# Altium footprint library SAMTEC SMD.PcbLib: 165 footprints (part 12 of 17)
Each footprint in its own frame and in the unit in brackets; x right, y up, seen from the top. Pads: shape width x height; smd on the part's side, far side on the other; paste and mask are expansions set on the pad; w line width, h text height; cw(c..) or ccw(c..) is an arc to the next point about the centre after c.
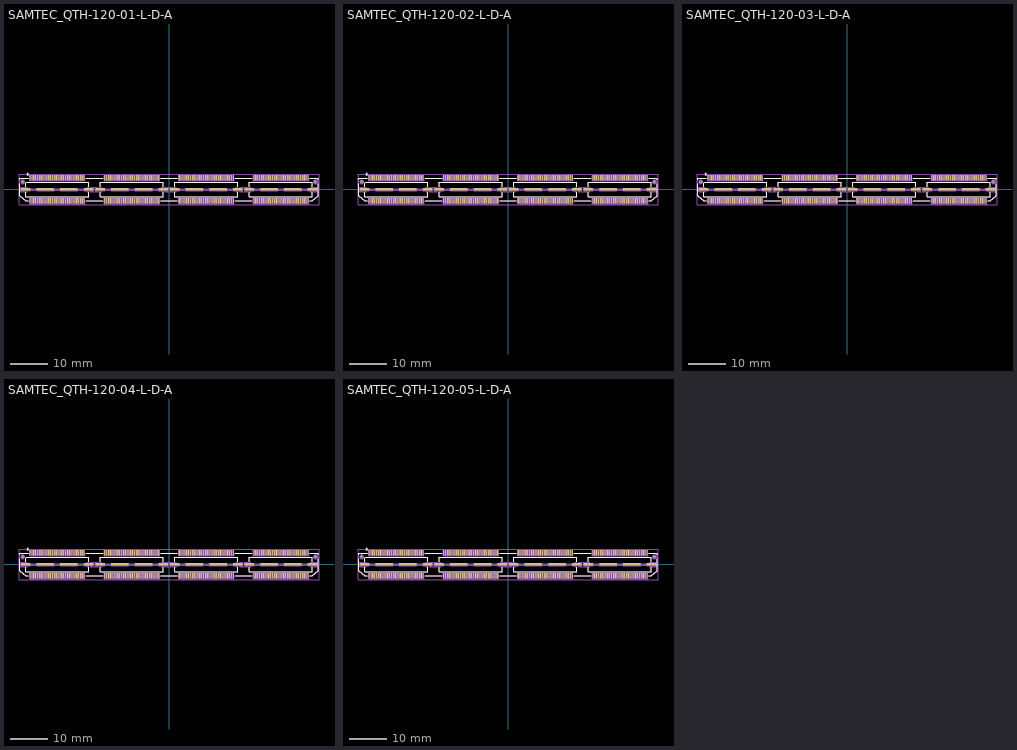
[diagram p11: the footprints below, top view; thin cyan lines are the x and y axes]

## SAMTEC_QTH-120-01-L-D-A [mm] "240  (4x60) Contacts, Pitch 0.5mm, Straight Double Row High Speed Ground Plane Header"
height 4.27
pads (258):
  rect 0.305x1.45 smd mask+0: 1(-37.255,3.086) 2(-37.255,-3.086) 3(-36.755,3.086) 4(-36.755,-3.086) 5(-36.255,3.086) 6(-36.255,-3.086) 7(-35.755,3.086) 8(-35.755,-3.086) 9(-35.255,3.086) 10(-35.255,-3.086) 11(-34.755,3.086) 12(-34.755,-3.086) 13(-34.255,3.086) 14(-34.255,-3.086) 15(-33.755,3.086) 16(-33.755,-3.086) 17(-33.255,3.086) 18(-33.255,-3.086) 19(-32.755,3.086) 20(-32.755,-3.086) 21(-32.255,3.086) 22(-32.255,-3.086) 23(-31.755,3.086) 24(-31.755,-3.086) 25(-31.255,3.086) 26(-31.255,-3.086) 27(-30.755,3.086) 28(-30.755,-3.086) 29(-30.255,3.086) 30(-30.255,-3.086) 31(-29.755,3.086) 32(-29.755,-3.086) 33(-29.255,3.086) 34(-29.255,-3.086) 35(-28.755,3.086) 36(-28.755,-3.086) 37(-28.255,3.086) 38(-28.255,-3.086) 39(-27.755,3.086) 40(-27.755,-3.086) 41(-27.255,3.086) 42(-27.255,-3.086) 43(-26.755,3.086) 44(-26.755,-3.086) 45(-26.255,3.086) 46(-26.255,-3.086) 47(-25.755,3.086) 48(-25.755,-3.086) 49(-25.255,3.086) 50(-25.255,-3.086) 51(-24.755,3.086) 52(-24.755,-3.086) 53(-24.255,3.086) 54(-24.255,-3.086) 55(-23.755,3.086) 56(-23.755,-3.086) 57(-23.255,3.086) 58(-23.255,-3.086) 59(-22.755,3.086) 60(-22.755,-3.086) 61(-17.252,3.086) 62(-17.252,-3.086) 63(-16.752,3.086) 64(-16.752,-3.086) 65(-16.252,3.086) 66(-16.252,-3.086) 67(-15.752,3.086) 68(-15.752,-3.086) 69(-15.252,3.086) 70(-15.252,-3.086) 71(-14.752,3.086) 72(-14.752,-3.086) 73(-14.252,3.086) 74(-14.252,-3.086) 75(-13.752,3.086) 76(-13.752,-3.086) 77(-13.252,3.086) 78(-13.252,-3.086) 79(-12.752,3.086) 80(-12.752,-3.086) 81(-12.252,3.086) 82(-12.252,-3.086) 83(-11.752,3.086) 84(-11.752,-3.086) 85(-11.252,3.086) 86(-11.252,-3.086) 87(-10.752,3.086) 88(-10.752,-3.086) 89(-10.252,3.086) 90(-10.252,-3.086) 91(-9.752,3.086) 92(-9.752,-3.086) 93(-9.252,3.086) 94(-9.252,-3.086) 95(-8.752,3.086) 96(-8.752,-3.086) 97(-8.252,3.086) 98(-8.252,-3.086) 99(-7.752,3.086) 100(-7.752,-3.086) 101(-7.252,3.086) 102(-7.252,-3.086) 103(-6.752,3.086) 104(-6.752,-3.086) 105(-6.252,3.086) 106(-6.252,-3.086) 107(-5.752,3.086) 108(-5.752,-3.086) 109(-5.252,3.086) 110(-5.252,-3.086) 111(-4.752,3.086) 112(-4.752,-3.086) 113(-4.252,3.086) 114(-4.252,-3.086) 115(-3.752,3.086) 116(-3.752,-3.086) 117(-3.252,3.086) 118(-3.252,-3.086) 119(-2.752,3.086) 120(-2.752,-3.086) 121(2.752,3.086) 122(2.752,-3.086) 123(3.251,3.086) 124(3.251,-3.086) 125(3.751,3.086) 126(3.751,-3.086) 127(4.252,3.086) 128(4.252,-3.086) 129(4.751,3.086) 130(4.751,-3.086) 131(5.252,3.086) 132(5.252,-3.086) 133(5.751,3.086) 134(5.751,-3.086) 135(6.251,3.086) 136(6.251,-3.086) 137(6.752,3.086) 138(6.752,-3.086) 139(7.251,3.086) 140(7.251,-3.086) 141(7.752,3.086) 142(7.752,-3.086) 143(8.251,3.086) 144(8.251,-3.086) 145(8.751,3.086) 146(8.751,-3.086) 147(9.252,3.086) 148(9.252,-3.086) 149(9.751,3.086) 150(9.751,-3.086) 151(10.252,3.086) 152(10.252,-3.086) 153(10.751,3.086) 154(10.751,-3.086) 155(11.251,3.086) 156(11.251,-3.086) 157(11.752,3.086) 158(11.752,-3.086) 159(12.251,3.086) 160(12.251,-3.086) 161(12.751,3.086) 162(12.751,-3.086) 163(13.252,3.086) 164(13.252,-3.086) 165(13.751,3.086) 166(13.751,-3.086) 167(14.252,3.086) 168(14.252,-3.086) 169(14.751,3.086) 170(14.751,-3.086) 171(15.251,3.086) 172(15.251,-3.086) 173(15.752,3.086) 174(15.752,-3.086) 175(16.251,3.086) 176(16.251,-3.086) 177(16.751,3.086) 178(16.751,-3.086) 179(17.252,3.086) 180(17.252,-3.086) 181(22.755,3.086) 182(22.755,-3.086) 183(23.255,3.086) 184(23.255,-3.086) 185(23.755,3.086) 186(23.755,-3.086) 187(24.255,3.086) 188(24.255,-3.086) 189(24.755,3.086) 190(24.755,-3.086) 191(25.255,3.086) 192(25.255,-3.086) 193(25.755,3.086) 194(25.755,-3.086) 195(26.255,3.086) 196(26.255,-3.086) 197(26.755,3.086) 198(26.755,-3.086) 199(27.255,3.086) 200(27.255,-3.086) 201(27.755,3.086) 202(27.755,-3.086) 203(28.255,3.086) 204(28.255,-3.086) 205(28.755,3.086) 206(28.755,-3.086) 207(29.255,3.086) 208(29.255,-3.086) 209(29.755,3.086) 210(29.755,-3.086) 211(30.255,3.086) 212(30.255,-3.086) 213(30.755,3.086) 214(30.755,-3.086) 215(31.255,3.086) 216(31.255,-3.086) 217(31.755,3.086) 218(31.755,-3.086) 219(32.255,3.086) 220(32.255,-3.086) 221(32.755,3.086) 222(32.755,-3.086) 223(33.255,3.086) 224(33.255,-3.086) 225(33.755,3.086) 226(33.755,-3.086) 227(34.255,3.086) 228(34.255,-3.086) 229(34.755,3.086) 230(34.755,-3.086) 231(35.255,3.086) 232(35.255,-3.086) 233(35.755,3.086) 234(35.755,-3.086) 235(36.255,3.086) 236(36.255,-3.086) 237(36.755,3.086) 238(36.755,-3.086) 239(37.255,3.086) 240(37.255,-3.086)
  rect 2.54x0.64 smd mask+0: 241(-38.45,0) 244(-21.56,0) 245(-18.447,0) 248(-1.557,0) 249(1.557,0) 252(18.447,0) 253(21.56,0) 256(38.45,0)
  rect 4.7x0.64 smd mask+0: 242(-33.18,0) 243(-26.83,0) 246(-13.177,0) 247(-6.827,0) 250(6.827,0) 251(13.177,0) 254(26.83,0) 255(33.18,0)
  round 0.5 hole 1 unplated mask+0.25: 257(-39.245,2.032) 258(39.245,2.032)
Top Overlay:
  circle w0.25: c-37.897,4.047 r0.125
  lines w0.2: -39.977,1.509 -39.977,-1.639 -38.454,-2.982 -37.807,-2.982 ; -39.977,2.555 -39.977,2.982 -37.807,2.982 ; -38.424,-0.72 -38.424,-1.967 -21.543,-1.967 -21.543,-0.72 ; -38.424,0.72 -38.424,1.664 ; -38.347,1.967 -21.543,1.967 -21.543,0.72 ; -22.202,-2.982 -17.804,-2.982 ; -22.202,2.982 -17.804,2.982 ; -18.437,-0.72 -18.437,-1.967 -1.556,-1.967 -1.556,-0.72 ; -18.437,0.72 -18.437,1.967 -1.556,1.967 -1.556,0.72 ; -2.199,-2.982 2.199,-2.982 ; -2.199,2.982 2.199,2.982 ; 1.551,-0.72 1.551,-1.967 18.431,-1.967 18.431,-0.72 ; 1.551,0.72 1.551,1.967 18.431,1.967 18.431,0.72 ; 17.804,-2.982 22.202,-2.982 ; 17.804,2.982 22.202,2.982 ; 21.538,-0.72 21.538,-1.967 38.419,-1.967 38.419,-0.72 ; 21.538,0.72 21.538,1.967 38.347,1.967 ; 37.807,-2.982 38.449,-2.982 39.972,-1.639 39.972,1.502 ; 37.807,2.982 39.972,2.982 39.972,2.562 ; 38.419,0.72 38.419,1.675
Mechanical 8:
  drawing of 1550 lines, arcs and shapes, not listed
Mechanical 14:
  circle w0.1: c-37.895,4.047 r0.25
  lines w0.1: -38.708,-0.19 -39.438,-0.19 -39.438,0.19 -38.708,0.19 ; -38.424,-0.571 -38.008,-0.571 -38.008,-0.193 -38.159,-0.193 -38.159,0.193 -38.008,0.193 -38.008,0.571 -38.424,0.571 ; -21.543,-0.571 -21.959,-0.571 -21.959,-0.193 -21.808,-0.193 -21.808,0.193 -21.959,0.193 -21.959,0.571 -21.543,0.571 ; -21.069,-0.19 -20.529,-0.19 -20.529,0.19 -21.069,0.19 ; -18.911,-0.19 -19.451,-0.19 -19.451,0.19 -18.911,0.19 ; -18.437,-0.571 -18.02,-0.571 -18.02,-0.193 -18.171,-0.193 -18.171,0.193 -18.02,0.193 -18.02,0.571 -18.437,0.571 ; -1.556,-0.571 -1.972,-0.571 -1.972,-0.193 -1.821,-0.193 -1.821,0.193 -1.972,0.193 -1.972,0.571 -1.556,0.571 ; -1.081,-0.19 -0.542,-0.19 -0.542,0.19 -1.081,0.19 ; 1.076,-0.19 0.537,-0.19 0.537,0.19 1.076,0.19 ; 1.551,-0.571 1.967,-0.571 1.967,-0.193 1.816,-0.193 1.816,0.193 1.967,0.193 1.967,0.571 1.551,0.571 ; 18.431,-0.571 18.015,-0.571 18.015,-0.193 18.166,-0.193 18.166,0.193 18.015,0.193 18.015,0.571 18.431,0.571 ; 18.906,-0.19 19.445,-0.19 19.445,0.19 18.906,0.19 ; 21.063,-0.19 20.524,-0.19 20.524,0.19 21.063,0.19 ; 21.538,-0.571 21.954,-0.571 21.954,-0.193 21.803,-0.193 21.803,0.193 21.954,0.193 21.954,0.571 21.538,0.571 ; 38.419,-0.571 38.003,-0.571 38.003,-0.193 38.154,-0.193 38.154,0.193 38.003,0.193 38.003,0.571 38.419,0.571 ; 38.703,-0.19 39.433,-0.19 39.433,0.19 38.703,0.19 ; -39.977,-1.639 -39.977,2.982 39.972,2.982 39.972,-1.639 38.449,-2.982 -38.454,-2.982 -39.977,-1.639 ; -39.723,-0.635 -39.723,0.631 -38.708,0.631 -38.708,-0.635 -39.723,-0.635 ; -38.424,-1.967 -38.424,1.967 -21.543,1.967 -21.543,-1.967 -38.424,-1.967 ; -38.156,-0.19 -38.156,0.19 -21.811,0.19 -21.811,-0.19 -38.156,-0.19 ; -21.069,-0.635 -21.069,0.635 -18.911,0.635 -18.911,-0.635 -21.069,-0.635 ; -18.437,-1.967 -18.437,1.967 -1.556,1.967 -1.556,-1.967 -18.437,-1.967 ; -18.169,-0.19 -18.169,0.19 -1.824,0.19 -1.824,-0.19 -18.169,-0.19 ; -1.081,-0.635 -1.081,0.635 1.076,0.635 1.076,-0.635 -1.081,-0.635 ; 1.551,-1.967 1.551,1.967 18.431,1.967 18.431,-1.967 1.551,-1.967 ; 1.819,-0.19 1.819,0.19 18.164,0.19 18.164,-0.19 1.819,-0.19 ; 18.906,-0.635 21.063,-0.635 21.063,0.635 18.906,0.635 18.906,-0.635 ; 21.538,-1.967 21.538,1.967 38.419,1.967 38.419,-1.967 21.538,-1.967 ; 21.806,-0.19 21.806,0.19 38.151,0.19 38.151,-0.19 21.806,-0.19 ; 38.703,-0.635 38.703,0.635 39.718,0.635 39.718,-0.635 38.703,-0.635
Mechanical 15:
  lines w0.05: -40.227,-4.061 40.222,-4.061 40.222,4.061 -40.227,4.061 -40.227,-4.061
3D body "SAMTEC_QTH-120-01-L-D-A.stp": height 4.27, standoff -0.73, extent -39.977,-3.553 39.972,3.553

## SAMTEC_QTH-120-02-L-D-A [mm] "240  (4x60) Contacts, Pitch 0.5mm, Straight Double Row High Speed Ground Plane Header (Lead Style 7.26mm)"
height 7.264
pads (258):
  rect 0.305x1.45 smd mask+0: 1(-37.255,3.086) 2(-37.255,-3.086) 3(-36.755,3.086) 4(-36.755,-3.086) 5(-36.255,3.086) 6(-36.255,-3.086) 7(-35.755,3.086) 8(-35.755,-3.086) 9(-35.255,3.086) 10(-35.255,-3.086) 11(-34.755,3.086) 12(-34.755,-3.086) 13(-34.255,3.086) 14(-34.255,-3.086) 15(-33.755,3.086) 16(-33.755,-3.086) 17(-33.255,3.086) 18(-33.255,-3.086) 19(-32.755,3.086) 20(-32.755,-3.086) 21(-32.255,3.086) 22(-32.255,-3.086) 23(-31.755,3.086) 24(-31.755,-3.086) 25(-31.255,3.086) 26(-31.255,-3.086) 27(-30.755,3.086) 28(-30.755,-3.086) 29(-30.255,3.086) 30(-30.255,-3.086) 31(-29.755,3.086) 32(-29.755,-3.086) 33(-29.255,3.086) 34(-29.255,-3.086) 35(-28.755,3.086) 36(-28.755,-3.086) 37(-28.255,3.086) 38(-28.255,-3.086) 39(-27.755,3.086) 40(-27.755,-3.086) 41(-27.255,3.086) 42(-27.255,-3.086) 43(-26.755,3.086) 44(-26.755,-3.086) 45(-26.255,3.086) 46(-26.255,-3.086) 47(-25.755,3.086) 48(-25.755,-3.086) 49(-25.255,3.086) 50(-25.255,-3.086) 51(-24.755,3.086) 52(-24.755,-3.086) 53(-24.255,3.086) 54(-24.255,-3.086) 55(-23.755,3.086) 56(-23.755,-3.086) 57(-23.255,3.086) 58(-23.255,-3.086) 59(-22.755,3.086) 60(-22.755,-3.086) 61(-17.252,3.086) 62(-17.252,-3.086) 63(-16.752,3.086) 64(-16.752,-3.086) 65(-16.252,3.086) 66(-16.252,-3.086) 67(-15.752,3.086) 68(-15.752,-3.086) 69(-15.252,3.086) 70(-15.252,-3.086) 71(-14.752,3.086) 72(-14.752,-3.086) 73(-14.252,3.086) 74(-14.252,-3.086) 75(-13.752,3.086) 76(-13.752,-3.086) 77(-13.252,3.086) 78(-13.252,-3.086) 79(-12.752,3.086) 80(-12.752,-3.086) 81(-12.252,3.086) 82(-12.252,-3.086) 83(-11.752,3.086) 84(-11.752,-3.086) 85(-11.252,3.086) 86(-11.252,-3.086) 87(-10.752,3.086) 88(-10.752,-3.086) 89(-10.252,3.086) 90(-10.252,-3.086) 91(-9.752,3.086) 92(-9.752,-3.086) 93(-9.252,3.086) 94(-9.252,-3.086) 95(-8.752,3.086) 96(-8.752,-3.086) 97(-8.252,3.086) 98(-8.252,-3.086) 99(-7.752,3.086) 100(-7.752,-3.086) 101(-7.252,3.086) 102(-7.252,-3.086) 103(-6.752,3.086) 104(-6.752,-3.086) 105(-6.252,3.086) 106(-6.252,-3.086) 107(-5.752,3.086) 108(-5.752,-3.086) 109(-5.252,3.086) 110(-5.252,-3.086) 111(-4.752,3.086) 112(-4.752,-3.086) 113(-4.252,3.086) 114(-4.252,-3.086) 115(-3.752,3.086) 116(-3.752,-3.086) 117(-3.252,3.086) 118(-3.252,-3.086) 119(-2.752,3.086) 120(-2.752,-3.086) 121(2.752,3.086) 122(2.752,-3.086) 123(3.251,3.086) 124(3.251,-3.086) 125(3.751,3.086) 126(3.751,-3.086) 127(4.252,3.086) 128(4.252,-3.086) 129(4.751,3.086) 130(4.751,-3.086) 131(5.252,3.086) 132(5.252,-3.086) 133(5.751,3.086) 134(5.751,-3.086) 135(6.251,3.086) 136(6.251,-3.086) 137(6.752,3.086) 138(6.752,-3.086) 139(7.251,3.086) 140(7.251,-3.086) 141(7.752,3.086) 142(7.752,-3.086) 143(8.251,3.086) 144(8.251,-3.086) 145(8.751,3.086) 146(8.751,-3.086) 147(9.252,3.086) 148(9.252,-3.086) 149(9.751,3.086) 150(9.751,-3.086) 151(10.252,3.086) 152(10.252,-3.086) 153(10.751,3.086) 154(10.751,-3.086) 155(11.251,3.086) 156(11.251,-3.086) 157(11.752,3.086) 158(11.752,-3.086) 159(12.251,3.086) 160(12.251,-3.086) 161(12.751,3.086) 162(12.751,-3.086) 163(13.252,3.086) 164(13.252,-3.086) 165(13.751,3.086) 166(13.751,-3.086) 167(14.252,3.086) 168(14.252,-3.086) 169(14.751,3.086) 170(14.751,-3.086) 171(15.251,3.086) 172(15.251,-3.086) 173(15.752,3.086) 174(15.752,-3.086) 175(16.251,3.086) 176(16.251,-3.086) 177(16.751,3.086) 178(16.751,-3.086) 179(17.252,3.086) 180(17.252,-3.086) 181(22.755,3.086) 182(22.755,-3.086) 183(23.255,3.086) 184(23.255,-3.086) 185(23.755,3.086) 186(23.755,-3.086) 187(24.255,3.086) 188(24.255,-3.086) 189(24.755,3.086) 190(24.755,-3.086) 191(25.255,3.086) 192(25.255,-3.086) 193(25.755,3.086) 194(25.755,-3.086) 195(26.255,3.086) 196(26.255,-3.086) 197(26.755,3.086) 198(26.755,-3.086) 199(27.255,3.086) 200(27.255,-3.086) 201(27.755,3.086) 202(27.755,-3.086) 203(28.255,3.086) 204(28.255,-3.086) 205(28.755,3.086) 206(28.755,-3.086) 207(29.255,3.086) 208(29.255,-3.086) 209(29.755,3.086) 210(29.755,-3.086) 211(30.255,3.086) 212(30.255,-3.086) 213(30.755,3.086) 214(30.755,-3.086) 215(31.255,3.086) 216(31.255,-3.086) 217(31.755,3.086) 218(31.755,-3.086) 219(32.255,3.086) 220(32.255,-3.086) 221(32.755,3.086) 222(32.755,-3.086) 223(33.255,3.086) 224(33.255,-3.086) 225(33.755,3.086) 226(33.755,-3.086) 227(34.255,3.086) 228(34.255,-3.086) 229(34.755,3.086) 230(34.755,-3.086) 231(35.255,3.086) 232(35.255,-3.086) 233(35.755,3.086) 234(35.755,-3.086) 235(36.255,3.086) 236(36.255,-3.086) 237(36.755,3.086) 238(36.755,-3.086) 239(37.255,3.086) 240(37.255,-3.086)
  rect 2.54x0.64 smd mask+0: 241(-38.45,0) 244(-21.56,0) 245(-18.447,0) 248(-1.557,0) 249(1.557,0) 252(18.447,0) 253(21.56,0) 256(38.45,0)
  rect 4.7x0.64 smd mask+0: 242(-33.18,0) 243(-26.83,0) 246(-13.177,0) 247(-6.827,0) 250(6.827,0) 251(13.177,0) 254(26.83,0) 255(33.18,0)
  round 0.5 hole 1 unplated mask+0.25: 257(-39.245,2.032) 258(39.245,2.032)
Top Overlay:
  circle w0.25: c-37.897,4.047 r0.125
  lines w0.2: -39.977,1.509 -39.977,-1.639 -38.454,-2.982 -37.807,-2.982 ; -39.977,2.555 -39.977,2.982 -37.807,2.982 ; -38.424,-0.72 -38.424,-1.967 -21.543,-1.967 -21.543,-0.72 ; -38.424,0.72 -38.424,1.664 ; -38.347,1.967 -21.543,1.967 -21.543,0.72 ; -22.202,-2.982 -17.804,-2.982 ; -22.202,2.982 -17.804,2.982 ; -18.437,-0.72 -18.437,-1.967 -1.556,-1.967 -1.556,-0.72 ; -18.437,0.72 -18.437,1.967 -1.556,1.967 -1.556,0.72 ; -2.199,-2.982 2.199,-2.982 ; -2.199,2.982 2.199,2.982 ; 1.551,-0.72 1.551,-1.967 18.431,-1.967 18.431,-0.72 ; 1.551,0.72 1.551,1.967 18.431,1.967 18.431,0.72 ; 17.804,-2.982 22.202,-2.982 ; 17.804,2.982 22.202,2.982 ; 21.538,-0.72 21.538,-1.967 38.419,-1.967 38.419,-0.72 ; 21.538,0.72 21.538,1.967 38.347,1.967 ; 37.807,-2.982 38.449,-2.982 39.972,-1.639 39.972,1.502 ; 37.807,2.982 39.972,2.982 39.972,2.562 ; 38.419,0.72 38.419,1.675
Mechanical 8:
  drawing of 1550 lines, arcs and shapes, not listed
Mechanical 14:
  circle w0.1: c-37.895,4.047 r0.25
  lines w0.1: -38.708,-0.19 -39.438,-0.19 -39.438,0.19 -38.708,0.19 ; -38.424,-0.571 -38.008,-0.571 -38.008,-0.193 -38.159,-0.193 -38.159,0.193 -38.008,0.193 -38.008,0.571 -38.424,0.571 ; -21.543,-0.571 -21.959,-0.571 -21.959,-0.193 -21.808,-0.193 -21.808,0.193 -21.959,0.193 -21.959,0.571 -21.543,0.571 ; -21.069,-0.19 -20.529,-0.19 -20.529,0.19 -21.069,0.19 ; -18.911,-0.19 -19.451,-0.19 -19.451,0.19 -18.911,0.19 ; -18.437,-0.571 -18.02,-0.571 -18.02,-0.193 -18.171,-0.193 -18.171,0.193 -18.02,0.193 -18.02,0.571 -18.437,0.571 ; -1.556,-0.571 -1.972,-0.571 -1.972,-0.193 -1.821,-0.193 -1.821,0.193 -1.972,0.193 -1.972,0.571 -1.556,0.571 ; -1.081,-0.19 -0.542,-0.19 -0.542,0.19 -1.081,0.19 ; 1.076,-0.19 0.537,-0.19 0.537,0.19 1.076,0.19 ; 1.551,-0.571 1.967,-0.571 1.967,-0.193 1.816,-0.193 1.816,0.193 1.967,0.193 1.967,0.571 1.551,0.571 ; 18.431,-0.571 18.015,-0.571 18.015,-0.193 18.166,-0.193 18.166,0.193 18.015,0.193 18.015,0.571 18.431,0.571 ; 18.906,-0.19 19.445,-0.19 19.445,0.19 18.906,0.19 ; 21.063,-0.19 20.524,-0.19 20.524,0.19 21.063,0.19 ; 21.538,-0.571 21.954,-0.571 21.954,-0.193 21.803,-0.193 21.803,0.193 21.954,0.193 21.954,0.571 21.538,0.571 ; 38.419,-0.571 38.003,-0.571 38.003,-0.193 38.154,-0.193 38.154,0.193 38.003,0.193 38.003,0.571 38.419,0.571 ; 38.703,-0.19 39.433,-0.19 39.433,0.19 38.703,0.19 ; -39.977,-1.639 -38.454,-2.982 38.449,-2.982 39.972,-1.639 39.972,2.982 -39.977,2.982 -39.977,-1.639 ; -39.723,-0.635 -38.708,-0.635 -38.708,0.631 -39.723,0.631 -39.723,-0.635 ; -38.424,-1.967 -21.543,-1.967 -21.543,1.967 -38.424,1.967 -38.424,-1.967 ; -38.156,-0.19 -21.811,-0.19 -21.811,0.19 -38.156,0.19 -38.156,-0.19 ; -21.069,-0.635 -18.911,-0.635 -18.911,0.635 -21.069,0.635 -21.069,-0.635 ; -18.437,-1.967 -1.556,-1.967 -1.556,1.967 -18.437,1.967 -18.437,-1.967 ; -18.169,-0.19 -1.824,-0.19 -1.824,0.19 -18.169,0.19 -18.169,-0.19 ; -1.081,-0.635 1.076,-0.635 1.076,0.635 -1.081,0.635 -1.081,-0.635 ; 1.551,-1.967 18.431,-1.967 18.431,1.967 1.551,1.967 1.551,-1.967 ; 1.819,-0.19 18.164,-0.19 18.164,0.19 1.819,0.19 1.819,-0.19 ; 18.906,-0.635 18.906,0.635 21.063,0.635 21.063,-0.635 18.906,-0.635 ; 21.538,-1.967 38.419,-1.967 38.419,1.967 21.538,1.967 21.538,-1.967 ; 21.806,-0.19 38.151,-0.19 38.151,0.19 21.806,0.19 21.806,-0.19 ; 38.703,-0.635 39.718,-0.635 39.718,0.635 38.703,0.635 38.703,-0.635
Mechanical 15:
  lines w0.05: -40.227,-4.061 -40.227,4.061 40.222,4.061 40.222,-4.061 -40.227,-4.061
3D body "SAMTEC_QTH-120-02-L-D-A.stp": height 7.26, standoff -0.73, extent -40.002,-3.553 39.947,3.553

## SAMTEC_QTH-120-03-L-D-A [mm] "240  (4x60) Contacts, Pitch 0.5mm, Straight Double Row High Speed Ground Plane Header (Lead Style 10.27mm)"
height 10.27
pads (258):
  rect 0.305x1.45 smd mask+0: 1(-37.255,3.086) 2(-37.255,-3.086) 3(-36.755,3.086) 4(-36.755,-3.086) 5(-36.255,3.086) 6(-36.255,-3.086) 7(-35.755,3.086) 8(-35.755,-3.086) 9(-35.255,3.086) 10(-35.255,-3.086) 11(-34.755,3.086) 12(-34.755,-3.086) 13(-34.255,3.086) 14(-34.255,-3.086) 15(-33.755,3.086) 16(-33.755,-3.086) 17(-33.255,3.086) 18(-33.255,-3.086) 19(-32.755,3.086) 20(-32.755,-3.086) 21(-32.255,3.086) 22(-32.255,-3.086) 23(-31.755,3.086) 24(-31.755,-3.086) 25(-31.255,3.086) 26(-31.255,-3.086) 27(-30.755,3.086) 28(-30.755,-3.086) 29(-30.255,3.086) 30(-30.255,-3.086) 31(-29.755,3.086) 32(-29.755,-3.086) 33(-29.255,3.086) 34(-29.255,-3.086) 35(-28.755,3.086) 36(-28.755,-3.086) 37(-28.255,3.086) 38(-28.255,-3.086) 39(-27.755,3.086) 40(-27.755,-3.086) 41(-27.255,3.086) 42(-27.255,-3.086) 43(-26.755,3.086) 44(-26.755,-3.086) 45(-26.255,3.086) 46(-26.255,-3.086) 47(-25.755,3.086) 48(-25.755,-3.086) 49(-25.255,3.086) 50(-25.255,-3.086) 51(-24.755,3.086) 52(-24.755,-3.086) 53(-24.255,3.086) 54(-24.255,-3.086) 55(-23.755,3.086) 56(-23.755,-3.086) 57(-23.255,3.086) 58(-23.255,-3.086) 59(-22.755,3.086) 60(-22.755,-3.086) 61(-17.252,3.086) 62(-17.252,-3.086) 63(-16.752,3.086) 64(-16.752,-3.086) 65(-16.252,3.086) 66(-16.252,-3.086) 67(-15.752,3.086) 68(-15.752,-3.086) 69(-15.252,3.086) 70(-15.252,-3.086) 71(-14.752,3.086) 72(-14.752,-3.086) 73(-14.252,3.086) 74(-14.252,-3.086) 75(-13.752,3.086) 76(-13.752,-3.086) 77(-13.252,3.086) 78(-13.252,-3.086) 79(-12.752,3.086) 80(-12.752,-3.086) 81(-12.252,3.086) 82(-12.252,-3.086) 83(-11.752,3.086) 84(-11.752,-3.086) 85(-11.252,3.086) 86(-11.252,-3.086) 87(-10.752,3.086) 88(-10.752,-3.086) 89(-10.252,3.086) 90(-10.252,-3.086) 91(-9.752,3.086) 92(-9.752,-3.086) 93(-9.252,3.086) 94(-9.252,-3.086) 95(-8.752,3.086) 96(-8.752,-3.086) 97(-8.252,3.086) 98(-8.252,-3.086) 99(-7.752,3.086) 100(-7.752,-3.086) 101(-7.252,3.086) 102(-7.252,-3.086) 103(-6.752,3.086) 104(-6.752,-3.086) 105(-6.252,3.086) 106(-6.252,-3.086) 107(-5.752,3.086) 108(-5.752,-3.086) 109(-5.252,3.086) 110(-5.252,-3.086) 111(-4.752,3.086) 112(-4.752,-3.086) 113(-4.252,3.086) 114(-4.252,-3.086) 115(-3.752,3.086) 116(-3.752,-3.086) 117(-3.252,3.086) 118(-3.252,-3.086) 119(-2.752,3.086) 120(-2.752,-3.086) 121(2.752,3.086) 122(2.752,-3.086) 123(3.251,3.086) 124(3.251,-3.086) 125(3.751,3.086) 126(3.751,-3.086) 127(4.252,3.086) 128(4.252,-3.086) 129(4.751,3.086) 130(4.751,-3.086) 131(5.252,3.086) 132(5.252,-3.086) 133(5.751,3.086) 134(5.751,-3.086) 135(6.251,3.086) 136(6.251,-3.086) 137(6.752,3.086) 138(6.752,-3.086) 139(7.251,3.086) 140(7.251,-3.086) 141(7.752,3.086) 142(7.752,-3.086) 143(8.251,3.086) 144(8.251,-3.086) 145(8.751,3.086) 146(8.751,-3.086) 147(9.252,3.086) 148(9.252,-3.086) 149(9.751,3.086) 150(9.751,-3.086) 151(10.252,3.086) 152(10.252,-3.086) 153(10.751,3.086) 154(10.751,-3.086) 155(11.251,3.086) 156(11.251,-3.086) 157(11.752,3.086) 158(11.752,-3.086) 159(12.251,3.086) 160(12.251,-3.086) 161(12.751,3.086) 162(12.751,-3.086) 163(13.252,3.086) 164(13.252,-3.086) 165(13.751,3.086) 166(13.751,-3.086) 167(14.252,3.086) 168(14.252,-3.086) 169(14.751,3.086) 170(14.751,-3.086) 171(15.251,3.086) 172(15.251,-3.086) 173(15.752,3.086) 174(15.752,-3.086) 175(16.251,3.086) 176(16.251,-3.086) 177(16.751,3.086) 178(16.751,-3.086) 179(17.252,3.086) 180(17.252,-3.086) 181(22.755,3.086) 182(22.755,-3.086) 183(23.255,3.086) 184(23.255,-3.086) 185(23.755,3.086) 186(23.755,-3.086) 187(24.255,3.086) 188(24.255,-3.086) 189(24.755,3.086) 190(24.755,-3.086) 191(25.255,3.086) 192(25.255,-3.086) 193(25.755,3.086) 194(25.755,-3.086) 195(26.255,3.086) 196(26.255,-3.086) 197(26.755,3.086) 198(26.755,-3.086) 199(27.255,3.086) 200(27.255,-3.086) 201(27.755,3.086) 202(27.755,-3.086) 203(28.255,3.086) 204(28.255,-3.086) 205(28.755,3.086) 206(28.755,-3.086) 207(29.255,3.086) 208(29.255,-3.086) 209(29.755,3.086) 210(29.755,-3.086) 211(30.255,3.086) 212(30.255,-3.086) 213(30.755,3.086) 214(30.755,-3.086) 215(31.255,3.086) 216(31.255,-3.086) 217(31.755,3.086) 218(31.755,-3.086) 219(32.255,3.086) 220(32.255,-3.086) 221(32.755,3.086) 222(32.755,-3.086) 223(33.255,3.086) 224(33.255,-3.086) 225(33.755,3.086) 226(33.755,-3.086) 227(34.255,3.086) 228(34.255,-3.086) 229(34.755,3.086) 230(34.755,-3.086) 231(35.255,3.086) 232(35.255,-3.086) 233(35.755,3.086) 234(35.755,-3.086) 235(36.255,3.086) 236(36.255,-3.086) 237(36.755,3.086) 238(36.755,-3.086) 239(37.255,3.086) 240(37.255,-3.086)
  rect 2.54x0.64 smd mask+0: 241(-38.45,0) 244(-21.56,0) 245(-18.447,0) 248(-1.557,0) 249(1.557,0) 252(18.447,0) 253(21.56,0) 256(38.45,0)
  rect 4.7x0.64 smd mask+0: 242(-33.18,0) 243(-26.83,0) 246(-13.177,0) 247(-6.827,0) 250(6.827,0) 251(13.177,0) 254(26.83,0) 255(33.18,0)
  round 0.5 hole 1 unplated mask+0.25: 257(-39.245,2.032) 258(39.245,2.032)
Top Overlay:
  circle w0.25: c-37.897,4.047 r0.125
  lines w0.2: -39.977,1.509 -39.977,-1.639 -38.454,-2.982 -37.807,-2.982 ; -39.977,2.555 -39.977,2.982 -37.807,2.982 ; -38.424,-0.72 -38.424,-1.967 -21.543,-1.967 -21.543,-0.72 ; -38.424,0.72 -38.424,1.664 ; -38.347,1.967 -21.543,1.967 -21.543,0.72 ; -22.202,-2.982 -17.804,-2.982 ; -22.202,2.982 -17.804,2.982 ; -18.437,-0.72 -18.437,-1.967 -1.556,-1.967 -1.556,-0.72 ; -18.437,0.72 -18.437,1.967 -1.556,1.967 -1.556,0.72 ; -2.199,-2.982 2.199,-2.982 ; -2.199,2.982 2.199,2.982 ; 1.551,-0.72 1.551,-1.967 18.431,-1.967 18.431,-0.72 ; 1.551,0.72 1.551,1.967 18.431,1.967 18.431,0.72 ; 17.804,-2.982 22.202,-2.982 ; 17.804,2.982 22.202,2.982 ; 21.538,-0.72 21.538,-1.967 38.419,-1.967 38.419,-0.72 ; 21.538,0.72 21.538,1.967 38.347,1.967 ; 37.807,-2.982 38.449,-2.982 39.972,-1.639 39.972,1.502 ; 37.807,2.982 39.972,2.982 39.972,2.562 ; 38.419,0.72 38.419,1.675
Mechanical 8:
  drawing of 1550 lines, arcs and shapes, not listed
Mechanical 14:
  circle w0.1: c-37.895,4.047 r0.25
  lines w0.1: -38.708,-0.19 -39.438,-0.19 -39.438,0.19 -38.708,0.19 ; -38.424,-0.571 -38.008,-0.571 -38.008,-0.193 -38.159,-0.193 -38.159,0.193 -38.008,0.193 -38.008,0.571 -38.424,0.571 ; -21.543,-0.571 -21.959,-0.571 -21.959,-0.193 -21.808,-0.193 -21.808,0.193 -21.959,0.193 -21.959,0.571 -21.543,0.571 ; -21.069,-0.19 -20.529,-0.19 -20.529,0.19 -21.069,0.19 ; -18.911,-0.19 -19.451,-0.19 -19.451,0.19 -18.911,0.19 ; -18.437,-0.571 -18.02,-0.571 -18.02,-0.193 -18.171,-0.193 -18.171,0.193 -18.02,0.193 -18.02,0.571 -18.437,0.571 ; -1.556,-0.571 -1.972,-0.571 -1.972,-0.193 -1.821,-0.193 -1.821,0.193 -1.972,0.193 -1.972,0.571 -1.556,0.571 ; -1.081,-0.19 -0.542,-0.19 -0.542,0.19 -1.081,0.19 ; 1.076,-0.19 0.537,-0.19 0.537,0.19 1.076,0.19 ; 1.551,-0.571 1.967,-0.571 1.967,-0.193 1.816,-0.193 1.816,0.193 1.967,0.193 1.967,0.571 1.551,0.571 ; 18.431,-0.571 18.015,-0.571 18.015,-0.193 18.166,-0.193 18.166,0.193 18.015,0.193 18.015,0.571 18.431,0.571 ; 18.906,-0.19 19.445,-0.19 19.445,0.19 18.906,0.19 ; 21.063,-0.19 20.524,-0.19 20.524,0.19 21.063,0.19 ; 21.538,-0.571 21.954,-0.571 21.954,-0.193 21.803,-0.193 21.803,0.193 21.954,0.193 21.954,0.571 21.538,0.571 ; 38.419,-0.571 38.003,-0.571 38.003,-0.193 38.154,-0.193 38.154,0.193 38.003,0.193 38.003,0.571 38.419,0.571 ; 38.703,-0.19 39.433,-0.19 39.433,0.19 38.703,0.19 ; -39.977,-1.639 -38.454,-2.982 38.449,-2.982 39.972,-1.639 39.972,2.982 -39.977,2.982 -39.977,-1.639 ; -39.723,-0.635 -38.708,-0.635 -38.708,0.631 -39.723,0.631 -39.723,-0.635 ; -38.424,-1.967 -21.543,-1.967 -21.543,1.967 -38.424,1.967 -38.424,-1.967 ; -38.156,-0.19 -21.811,-0.19 -21.811,0.19 -38.156,0.19 -38.156,-0.19 ; -21.069,-0.635 -18.911,-0.635 -18.911,0.635 -21.069,0.635 -21.069,-0.635 ; -18.437,-1.967 -1.556,-1.967 -1.556,1.967 -18.437,1.967 -18.437,-1.967 ; -18.169,-0.19 -1.824,-0.19 -1.824,0.19 -18.169,0.19 -18.169,-0.19 ; -1.081,-0.635 1.076,-0.635 1.076,0.635 -1.081,0.635 -1.081,-0.635 ; 1.551,-1.967 18.431,-1.967 18.431,1.967 1.551,1.967 1.551,-1.967 ; 1.819,-0.19 18.164,-0.19 18.164,0.19 1.819,0.19 1.819,-0.19 ; 18.906,-0.635 18.906,0.635 21.063,0.635 21.063,-0.635 18.906,-0.635 ; 21.538,-1.967 38.419,-1.967 38.419,1.967 21.538,1.967 21.538,-1.967 ; 21.806,-0.19 38.151,-0.19 38.151,0.19 21.806,0.19 21.806,-0.19 ; 38.703,-0.635 39.718,-0.635 39.718,0.635 38.703,0.635 38.703,-0.635
Mechanical 15:
  lines w0.05: -40.227,-4.061 -40.227,4.061 40.222,4.061 40.222,-4.061 -40.227,-4.061
3D body "SAMTEC_QTH-120-03-L-D-A.stp": height 10.27, standoff -0.73, extent -39.977,-3.553 39.972,3.554

## SAMTEC_QTH-120-04-L-D-A [mm] "240  (4x60) Contacts, Pitch 0.5mm, Straight Double Row High Speed Ground Plane Header (Lead Style 15.25mm)"
height 15.25
pads (258):
  rect 0.305x1.45 smd mask+0: 1(-37.255,3.086) 2(-37.255,-3.086) 3(-36.755,3.086) 4(-36.755,-3.086) 5(-36.255,3.086) 6(-36.255,-3.086) 7(-35.755,3.086) 8(-35.755,-3.086) 9(-35.255,3.086) 10(-35.255,-3.086) 11(-34.755,3.086) 12(-34.755,-3.086) 13(-34.255,3.086) 14(-34.255,-3.086) 15(-33.755,3.086) 16(-33.755,-3.086) 17(-33.255,3.086) 18(-33.255,-3.086) 19(-32.755,3.086) 20(-32.755,-3.086) 21(-32.255,3.086) 22(-32.255,-3.086) 23(-31.755,3.086) 24(-31.755,-3.086) 25(-31.255,3.086) 26(-31.255,-3.086) 27(-30.755,3.086) 28(-30.755,-3.086) 29(-30.255,3.086) 30(-30.255,-3.086) 31(-29.755,3.086) 32(-29.755,-3.086) 33(-29.255,3.086) 34(-29.255,-3.086) 35(-28.755,3.086) 36(-28.755,-3.086) 37(-28.255,3.086) 38(-28.255,-3.086) 39(-27.755,3.086) 40(-27.755,-3.086) 41(-27.255,3.086) 42(-27.255,-3.086) 43(-26.755,3.086) 44(-26.755,-3.086) 45(-26.255,3.086) 46(-26.255,-3.086) 47(-25.755,3.086) 48(-25.755,-3.086) 49(-25.255,3.086) 50(-25.255,-3.086) 51(-24.755,3.086) 52(-24.755,-3.086) 53(-24.255,3.086) 54(-24.255,-3.086) 55(-23.755,3.086) 56(-23.755,-3.086) 57(-23.255,3.086) 58(-23.255,-3.086) 59(-22.755,3.086) 60(-22.755,-3.086) 61(-17.252,3.086) 62(-17.252,-3.086) 63(-16.752,3.086) 64(-16.752,-3.086) 65(-16.252,3.086) 66(-16.252,-3.086) 67(-15.752,3.086) 68(-15.752,-3.086) 69(-15.252,3.086) 70(-15.252,-3.086) 71(-14.752,3.086) 72(-14.752,-3.086) 73(-14.252,3.086) 74(-14.252,-3.086) 75(-13.752,3.086) 76(-13.752,-3.086) 77(-13.252,3.086) 78(-13.252,-3.086) 79(-12.752,3.086) 80(-12.752,-3.086) 81(-12.252,3.086) 82(-12.252,-3.086) 83(-11.752,3.086) 84(-11.752,-3.086) 85(-11.252,3.086) 86(-11.252,-3.086) 87(-10.752,3.086) 88(-10.752,-3.086) 89(-10.252,3.086) 90(-10.252,-3.086) 91(-9.752,3.086) 92(-9.752,-3.086) 93(-9.252,3.086) 94(-9.252,-3.086) 95(-8.752,3.086) 96(-8.752,-3.086) 97(-8.252,3.086) 98(-8.252,-3.086) 99(-7.752,3.086) 100(-7.752,-3.086) 101(-7.252,3.086) 102(-7.252,-3.086) 103(-6.752,3.086) 104(-6.752,-3.086) 105(-6.252,3.086) 106(-6.252,-3.086) 107(-5.752,3.086) 108(-5.752,-3.086) 109(-5.252,3.086) 110(-5.252,-3.086) 111(-4.752,3.086) 112(-4.752,-3.086) 113(-4.252,3.086) 114(-4.252,-3.086) 115(-3.752,3.086) 116(-3.752,-3.086) 117(-3.252,3.086) 118(-3.252,-3.086) 119(-2.752,3.086) 120(-2.752,-3.086) 121(2.752,3.086) 122(2.752,-3.086) 123(3.251,3.086) 124(3.251,-3.086) 125(3.751,3.086) 126(3.751,-3.086) 127(4.252,3.086) 128(4.252,-3.086) 129(4.751,3.086) 130(4.751,-3.086) 131(5.252,3.086) 132(5.252,-3.086) 133(5.751,3.086) 134(5.751,-3.086) 135(6.251,3.086) 136(6.251,-3.086) 137(6.752,3.086) 138(6.752,-3.086) 139(7.251,3.086) 140(7.251,-3.086) 141(7.752,3.086) 142(7.752,-3.086) 143(8.251,3.086) 144(8.251,-3.086) 145(8.751,3.086) 146(8.751,-3.086) 147(9.252,3.086) 148(9.252,-3.086) 149(9.751,3.086) 150(9.751,-3.086) 151(10.252,3.086) 152(10.252,-3.086) 153(10.751,3.086) 154(10.751,-3.086) 155(11.251,3.086) 156(11.251,-3.086) 157(11.752,3.086) 158(11.752,-3.086) 159(12.251,3.086) 160(12.251,-3.086) 161(12.751,3.086) 162(12.751,-3.086) 163(13.252,3.086) 164(13.252,-3.086) 165(13.751,3.086) 166(13.751,-3.086) 167(14.252,3.086) 168(14.252,-3.086) 169(14.751,3.086) 170(14.751,-3.086) 171(15.251,3.086) 172(15.251,-3.086) 173(15.752,3.086) 174(15.752,-3.086) 175(16.251,3.086) 176(16.251,-3.086) 177(16.751,3.086) 178(16.751,-3.086) 179(17.252,3.086) 180(17.252,-3.086) 181(22.755,3.086) 182(22.755,-3.086) 183(23.255,3.086) 184(23.255,-3.086) 185(23.755,3.086) 186(23.755,-3.086) 187(24.255,3.086) 188(24.255,-3.086) 189(24.755,3.086) 190(24.755,-3.086) 191(25.255,3.086) 192(25.255,-3.086) 193(25.755,3.086) 194(25.755,-3.086) 195(26.255,3.086) 196(26.255,-3.086) 197(26.755,3.086) 198(26.755,-3.086) 199(27.255,3.086) 200(27.255,-3.086) 201(27.755,3.086) 202(27.755,-3.086) 203(28.255,3.086) 204(28.255,-3.086) 205(28.755,3.086) 206(28.755,-3.086) 207(29.255,3.086) 208(29.255,-3.086) 209(29.755,3.086) 210(29.755,-3.086) 211(30.255,3.086) 212(30.255,-3.086) 213(30.755,3.086) 214(30.755,-3.086) 215(31.255,3.086) 216(31.255,-3.086) 217(31.755,3.086) 218(31.755,-3.086) 219(32.255,3.086) 220(32.255,-3.086) 221(32.755,3.086) 222(32.755,-3.086) 223(33.255,3.086) 224(33.255,-3.086) 225(33.755,3.086) 226(33.755,-3.086) 227(34.255,3.086) 228(34.255,-3.086) 229(34.755,3.086) 230(34.755,-3.086) 231(35.255,3.086) 232(35.255,-3.086) 233(35.755,3.086) 234(35.755,-3.086) 235(36.255,3.086) 236(36.255,-3.086) 237(36.755,3.086) 238(36.755,-3.086) 239(37.255,3.086) 240(37.255,-3.086)
  rect 2.54x0.64 smd mask+0: 241(-38.45,0) 244(-21.56,0) 245(-18.447,0) 248(-1.557,0) 249(1.557,0) 252(18.447,0) 253(21.56,0) 256(38.45,0)
  rect 4.7x0.64 smd mask+0: 242(-33.18,0) 243(-26.83,0) 246(-13.177,0) 247(-6.827,0) 250(6.827,0) 251(13.177,0) 254(26.83,0) 255(33.18,0)
  round 0.5 hole 1 unplated mask+0.25: 257(-39.245,2.032) 258(39.245,2.032)
Top Overlay:
  circle w0.25: c-37.897,4.047 r0.125
  lines w0.2: -39.977,1.509 -39.977,-1.639 -38.454,-2.982 -37.807,-2.982 ; -39.977,2.555 -39.977,2.982 -37.807,2.982 ; -38.424,-0.72 -38.424,-1.967 -21.543,-1.967 -21.543,-0.72 ; -38.424,0.72 -38.424,1.664 ; -38.347,1.967 -21.543,1.967 -21.543,0.72 ; -22.202,-2.982 -17.804,-2.982 ; -22.202,2.982 -17.804,2.982 ; -18.437,-0.72 -18.437,-1.967 -1.556,-1.967 -1.556,-0.72 ; -18.437,0.72 -18.437,1.967 -1.556,1.967 -1.556,0.72 ; -2.199,-2.982 2.199,-2.982 ; -2.199,2.982 2.199,2.982 ; 1.551,-0.72 1.551,-1.967 18.431,-1.967 18.431,-0.72 ; 1.551,0.72 1.551,1.967 18.431,1.967 18.431,0.72 ; 17.804,-2.982 22.202,-2.982 ; 17.804,2.982 22.202,2.982 ; 21.538,-0.72 21.538,-1.967 38.419,-1.967 38.419,-0.72 ; 21.538,0.72 21.538,1.967 38.347,1.967 ; 37.807,-2.982 38.449,-2.982 39.972,-1.639 39.972,1.502 ; 37.807,2.982 39.972,2.982 39.972,2.562 ; 38.419,0.72 38.419,1.675
Mechanical 8:
  drawing of 1550 lines, arcs and shapes, not listed
Mechanical 14:
  circle w0.1: c-37.895,4.047 r0.25
  lines w0.1: -38.708,-0.19 -39.438,-0.19 -39.438,0.19 -38.708,0.19 ; -38.424,-0.571 -38.008,-0.571 -38.008,-0.193 -38.159,-0.193 -38.159,0.193 -38.008,0.193 -38.008,0.571 -38.424,0.571 ; -21.543,-0.571 -21.959,-0.571 -21.959,-0.193 -21.808,-0.193 -21.808,0.193 -21.959,0.193 -21.959,0.571 -21.543,0.571 ; -21.069,-0.19 -20.529,-0.19 -20.529,0.19 -21.069,0.19 ; -18.911,-0.19 -19.451,-0.19 -19.451,0.19 -18.911,0.19 ; -18.437,-0.571 -18.02,-0.571 -18.02,-0.193 -18.171,-0.193 -18.171,0.193 -18.02,0.193 -18.02,0.571 -18.437,0.571 ; -1.556,-0.571 -1.972,-0.571 -1.972,-0.193 -1.821,-0.193 -1.821,0.193 -1.972,0.193 -1.972,0.571 -1.556,0.571 ; -1.081,-0.19 -0.542,-0.19 -0.542,0.19 -1.081,0.19 ; 1.076,-0.19 0.537,-0.19 0.537,0.19 1.076,0.19 ; 1.551,-0.571 1.967,-0.571 1.967,-0.193 1.816,-0.193 1.816,0.193 1.967,0.193 1.967,0.571 1.551,0.571 ; 18.431,-0.571 18.015,-0.571 18.015,-0.193 18.166,-0.193 18.166,0.193 18.015,0.193 18.015,0.571 18.431,0.571 ; 18.906,-0.19 19.445,-0.19 19.445,0.19 18.906,0.19 ; 21.063,-0.19 20.524,-0.19 20.524,0.19 21.063,0.19 ; 21.538,-0.571 21.954,-0.571 21.954,-0.193 21.803,-0.193 21.803,0.193 21.954,0.193 21.954,0.571 21.538,0.571 ; 38.419,-0.571 38.003,-0.571 38.003,-0.193 38.154,-0.193 38.154,0.193 38.003,0.193 38.003,0.571 38.419,0.571 ; 38.703,-0.19 39.433,-0.19 39.433,0.19 38.703,0.19 ; -39.977,-1.639 -38.454,-2.982 38.449,-2.982 39.972,-1.639 39.972,2.982 -39.977,2.982 -39.977,-1.639 ; -39.723,-0.635 -38.708,-0.635 -38.708,0.631 -39.723,0.631 -39.723,-0.635 ; -38.424,-1.967 -21.543,-1.967 -21.543,1.967 -38.424,1.967 -38.424,-1.967 ; -38.156,-0.19 -21.811,-0.19 -21.811,0.19 -38.156,0.19 -38.156,-0.19 ; -21.069,-0.635 -18.911,-0.635 -18.911,0.635 -21.069,0.635 -21.069,-0.635 ; -18.437,-1.967 -1.556,-1.967 -1.556,1.967 -18.437,1.967 -18.437,-1.967 ; -18.169,-0.19 -1.824,-0.19 -1.824,0.19 -18.169,0.19 -18.169,-0.19 ; -1.081,-0.635 1.076,-0.635 1.076,0.635 -1.081,0.635 -1.081,-0.635 ; 1.551,-1.967 18.431,-1.967 18.431,1.967 1.551,1.967 1.551,-1.967 ; 1.819,-0.19 18.164,-0.19 18.164,0.19 1.819,0.19 1.819,-0.19 ; 18.906,-0.635 18.906,0.635 21.063,0.635 21.063,-0.635 18.906,-0.635 ; 21.538,-1.967 38.419,-1.967 38.419,1.967 21.538,1.967 21.538,-1.967 ; 21.806,-0.19 38.151,-0.19 38.151,0.19 21.806,0.19 21.806,-0.19 ; 38.703,-0.635 39.718,-0.635 39.718,0.635 38.703,0.635 38.703,-0.635
Mechanical 15:
  lines w0.05: -40.227,-4.061 -40.227,4.061 40.222,4.061 40.222,-4.061 -40.227,-4.061
3D body "SAMTEC_QTH-120-04-L-D-A.stp": height 15.25, standoff -0.73, extent -40.002,-3.553 39.947,3.553

## SAMTEC_QTH-120-05-L-D-A [mm] "240  (4x60) Contacts, Pitch 0.5mm, Straight Double Row High Speed Ground Plane Header (Lead Style 18.26mm)"
height 18.26
pads (258):
  rect 0.305x1.45 smd mask+0: 1(-37.255,3.086) 2(-37.255,-3.086) 3(-36.755,3.086) 4(-36.755,-3.086) 5(-36.255,3.086) 6(-36.255,-3.086) 7(-35.755,3.086) 8(-35.755,-3.086) 9(-35.255,3.086) 10(-35.255,-3.086) 11(-34.755,3.086) 12(-34.755,-3.086) 13(-34.255,3.086) 14(-34.255,-3.086) 15(-33.755,3.086) 16(-33.755,-3.086) 17(-33.255,3.086) 18(-33.255,-3.086) 19(-32.755,3.086) 20(-32.755,-3.086) 21(-32.255,3.086) 22(-32.255,-3.086) 23(-31.755,3.086) 24(-31.755,-3.086) 25(-31.255,3.086) 26(-31.255,-3.086) 27(-30.755,3.086) 28(-30.755,-3.086) 29(-30.255,3.086) 30(-30.255,-3.086) 31(-29.755,3.086) 32(-29.755,-3.086) 33(-29.255,3.086) 34(-29.255,-3.086) 35(-28.755,3.086) 36(-28.755,-3.086) 37(-28.255,3.086) 38(-28.255,-3.086) 39(-27.755,3.086) 40(-27.755,-3.086) 41(-27.255,3.086) 42(-27.255,-3.086) 43(-26.755,3.086) 44(-26.755,-3.086) 45(-26.255,3.086) 46(-26.255,-3.086) 47(-25.755,3.086) 48(-25.755,-3.086) 49(-25.255,3.086) 50(-25.255,-3.086) 51(-24.755,3.086) 52(-24.755,-3.086) 53(-24.255,3.086) 54(-24.255,-3.086) 55(-23.755,3.086) 56(-23.755,-3.086) 57(-23.255,3.086) 58(-23.255,-3.086) 59(-22.755,3.086) 60(-22.755,-3.086) 61(-17.252,3.086) 62(-17.252,-3.086) 63(-16.752,3.086) 64(-16.752,-3.086) 65(-16.252,3.086) 66(-16.252,-3.086) 67(-15.752,3.086) 68(-15.752,-3.086) 69(-15.252,3.086) 70(-15.252,-3.086) 71(-14.752,3.086) 72(-14.752,-3.086) 73(-14.252,3.086) 74(-14.252,-3.086) 75(-13.752,3.086) 76(-13.752,-3.086) 77(-13.252,3.086) 78(-13.252,-3.086) 79(-12.752,3.086) 80(-12.752,-3.086) 81(-12.252,3.086) 82(-12.252,-3.086) 83(-11.752,3.086) 84(-11.752,-3.086) 85(-11.252,3.086) 86(-11.252,-3.086) 87(-10.752,3.086) 88(-10.752,-3.086) 89(-10.252,3.086) 90(-10.252,-3.086) 91(-9.752,3.086) 92(-9.752,-3.086) 93(-9.252,3.086) 94(-9.252,-3.086) 95(-8.752,3.086) 96(-8.752,-3.086) 97(-8.252,3.086) 98(-8.252,-3.086) 99(-7.752,3.086) 100(-7.752,-3.086) 101(-7.252,3.086) 102(-7.252,-3.086) 103(-6.752,3.086) 104(-6.752,-3.086) 105(-6.252,3.086) 106(-6.252,-3.086) 107(-5.752,3.086) 108(-5.752,-3.086) 109(-5.252,3.086) 110(-5.252,-3.086) 111(-4.752,3.086) 112(-4.752,-3.086) 113(-4.252,3.086) 114(-4.252,-3.086) 115(-3.752,3.086) 116(-3.752,-3.086) 117(-3.252,3.086) 118(-3.252,-3.086) 119(-2.752,3.086) 120(-2.752,-3.086) 121(2.752,3.086) 122(2.752,-3.086) 123(3.251,3.086) 124(3.251,-3.086) 125(3.751,3.086) 126(3.751,-3.086) 127(4.252,3.086) 128(4.252,-3.086) 129(4.751,3.086) 130(4.751,-3.086) 131(5.252,3.086) 132(5.252,-3.086) 133(5.751,3.086) 134(5.751,-3.086) 135(6.251,3.086) 136(6.251,-3.086) 137(6.752,3.086) 138(6.752,-3.086) 139(7.251,3.086) 140(7.251,-3.086) 141(7.752,3.086) 142(7.752,-3.086) 143(8.251,3.086) 144(8.251,-3.086) 145(8.751,3.086) 146(8.751,-3.086) 147(9.252,3.086) 148(9.252,-3.086) 149(9.751,3.086) 150(9.751,-3.086) 151(10.252,3.086) 152(10.252,-3.086) 153(10.751,3.086) 154(10.751,-3.086) 155(11.251,3.086) 156(11.251,-3.086) 157(11.752,3.086) 158(11.752,-3.086) 159(12.251,3.086) 160(12.251,-3.086) 161(12.751,3.086) 162(12.751,-3.086) 163(13.252,3.086) 164(13.252,-3.086) 165(13.751,3.086) 166(13.751,-3.086) 167(14.252,3.086) 168(14.252,-3.086) 169(14.751,3.086) 170(14.751,-3.086) 171(15.251,3.086) 172(15.251,-3.086) 173(15.752,3.086) 174(15.752,-3.086) 175(16.251,3.086) 176(16.251,-3.086) 177(16.751,3.086) 178(16.751,-3.086) 179(17.252,3.086) 180(17.252,-3.086) 181(22.755,3.086) 182(22.755,-3.086) 183(23.255,3.086) 184(23.255,-3.086) 185(23.755,3.086) 186(23.755,-3.086) 187(24.255,3.086) 188(24.255,-3.086) 189(24.755,3.086) 190(24.755,-3.086) 191(25.255,3.086) 192(25.255,-3.086) 193(25.755,3.086) 194(25.755,-3.086) 195(26.255,3.086) 196(26.255,-3.086) 197(26.755,3.086) 198(26.755,-3.086) 199(27.255,3.086) 200(27.255,-3.086) 201(27.755,3.086) 202(27.755,-3.086) 203(28.255,3.086) 204(28.255,-3.086) 205(28.755,3.086) 206(28.755,-3.086) 207(29.255,3.086) 208(29.255,-3.086) 209(29.755,3.086) 210(29.755,-3.086) 211(30.255,3.086) 212(30.255,-3.086) 213(30.755,3.086) 214(30.755,-3.086) 215(31.255,3.086) 216(31.255,-3.086) 217(31.755,3.086) 218(31.755,-3.086) 219(32.255,3.086) 220(32.255,-3.086) 221(32.755,3.086) 222(32.755,-3.086) 223(33.255,3.086) 224(33.255,-3.086) 225(33.755,3.086) 226(33.755,-3.086) 227(34.255,3.086) 228(34.255,-3.086) 229(34.755,3.086) 230(34.755,-3.086) 231(35.255,3.086) 232(35.255,-3.086) 233(35.755,3.086) 234(35.755,-3.086) 235(36.255,3.086) 236(36.255,-3.086) 237(36.755,3.086) 238(36.755,-3.086) 239(37.255,3.086) 240(37.255,-3.086)
  rect 2.54x0.64 smd mask+0: 241(-38.45,0) 244(-21.56,0) 245(-18.447,0) 248(-1.557,0) 249(1.557,0) 252(18.447,0) 253(21.56,0) 256(38.45,0)
  rect 4.7x0.64 smd mask+0: 242(-33.18,0) 243(-26.83,0) 246(-13.177,0) 247(-6.827,0) 250(6.827,0) 251(13.177,0) 254(26.83,0) 255(33.18,0)
  round 0.5 hole 1 unplated mask+0.25: 257(-39.245,2.032) 258(39.245,2.032)
Top Overlay:
  circle w0.25: c-37.897,4.047 r0.125
  lines w0.2: -39.977,1.509 -39.977,-1.639 -38.454,-2.982 -37.807,-2.982 ; -39.977,2.555 -39.977,2.982 -37.807,2.982 ; -38.424,-0.72 -38.424,-1.967 -21.543,-1.967 -21.543,-0.72 ; -38.424,0.72 -38.424,1.664 ; -38.347,1.967 -21.543,1.967 -21.543,0.72 ; -22.202,-2.982 -17.804,-2.982 ; -22.202,2.982 -17.804,2.982 ; -18.437,-0.72 -18.437,-1.967 -1.556,-1.967 -1.556,-0.72 ; -18.437,0.72 -18.437,1.967 -1.556,1.967 -1.556,0.72 ; -2.199,-2.982 2.199,-2.982 ; -2.199,2.982 2.199,2.982 ; 1.551,-0.72 1.551,-1.967 18.431,-1.967 18.431,-0.72 ; 1.551,0.72 1.551,1.967 18.431,1.967 18.431,0.72 ; 17.804,-2.982 22.202,-2.982 ; 17.804,2.982 22.202,2.982 ; 21.538,-0.72 21.538,-1.967 38.419,-1.967 38.419,-0.72 ; 21.538,0.72 21.538,1.967 38.347,1.967 ; 37.807,-2.982 38.449,-2.982 39.972,-1.639 39.972,1.502 ; 37.807,2.982 39.972,2.982 39.972,2.562 ; 38.419,0.72 38.419,1.675
Mechanical 8:
  drawing of 1550 lines, arcs and shapes, not listed
Mechanical 14:
  circle w0.1: c-37.895,4.047 r0.25
  lines w0.1: -38.708,-0.19 -39.438,-0.19 -39.438,0.19 -38.708,0.19 ; -38.424,-0.571 -38.008,-0.571 -38.008,-0.193 -38.159,-0.193 -38.159,0.193 -38.008,0.193 -38.008,0.571 -38.424,0.571 ; -21.543,-0.571 -21.959,-0.571 -21.959,-0.193 -21.808,-0.193 -21.808,0.193 -21.959,0.193 -21.959,0.571 -21.543,0.571 ; -21.069,-0.19 -20.529,-0.19 -20.529,0.19 -21.069,0.19 ; -18.911,-0.19 -19.451,-0.19 -19.451,0.19 -18.911,0.19 ; -18.437,-0.571 -18.02,-0.571 -18.02,-0.193 -18.171,-0.193 -18.171,0.193 -18.02,0.193 -18.02,0.571 -18.437,0.571 ; -1.556,-0.571 -1.972,-0.571 -1.972,-0.193 -1.821,-0.193 -1.821,0.193 -1.972,0.193 -1.972,0.571 -1.556,0.571 ; -1.081,-0.19 -0.542,-0.19 -0.542,0.19 -1.081,0.19 ; 1.076,-0.19 0.537,-0.19 0.537,0.19 1.076,0.19 ; 1.551,-0.571 1.967,-0.571 1.967,-0.193 1.816,-0.193 1.816,0.193 1.967,0.193 1.967,0.571 1.551,0.571 ; 18.431,-0.571 18.015,-0.571 18.015,-0.193 18.166,-0.193 18.166,0.193 18.015,0.193 18.015,0.571 18.431,0.571 ; 18.906,-0.19 19.445,-0.19 19.445,0.19 18.906,0.19 ; 21.063,-0.19 20.524,-0.19 20.524,0.19 21.063,0.19 ; 21.538,-0.571 21.954,-0.571 21.954,-0.193 21.803,-0.193 21.803,0.193 21.954,0.193 21.954,0.571 21.538,0.571 ; 38.419,-0.571 38.003,-0.571 38.003,-0.193 38.154,-0.193 38.154,0.193 38.003,0.193 38.003,0.571 38.419,0.571 ; 38.703,-0.19 39.433,-0.19 39.433,0.19 38.703,0.19 ; -39.977,-1.639 -39.977,2.982 39.972,2.982 39.972,-1.639 38.449,-2.982 -38.454,-2.982 -39.977,-1.639 ; -39.723,-0.635 -39.723,0.631 -38.708,0.631 -38.708,-0.635 -39.723,-0.635 ; -38.424,-1.967 -38.424,1.967 -21.543,1.967 -21.543,-1.967 -38.424,-1.967 ; -38.156,-0.19 -38.156,0.19 -21.811,0.19 -21.811,-0.19 -38.156,-0.19 ; -21.069,-0.635 -21.069,0.635 -18.911,0.635 -18.911,-0.635 -21.069,-0.635 ; -18.437,-1.967 -18.437,1.967 -1.556,1.967 -1.556,-1.967 -18.437,-1.967 ; -18.169,-0.19 -18.169,0.19 -1.824,0.19 -1.824,-0.19 -18.169,-0.19 ; -1.081,-0.635 -1.081,0.635 1.076,0.635 1.076,-0.635 -1.081,-0.635 ; 1.551,-1.967 1.551,1.967 18.431,1.967 18.431,-1.967 1.551,-1.967 ; 1.819,-0.19 1.819,0.19 18.164,0.19 18.164,-0.19 1.819,-0.19 ; 18.906,-0.635 21.063,-0.635 21.063,0.635 18.906,0.635 18.906,-0.635 ; 21.538,-1.967 21.538,1.967 38.419,1.967 38.419,-1.967 21.538,-1.967 ; 21.806,-0.19 21.806,0.19 38.151,0.19 38.151,-0.19 21.806,-0.19 ; 38.703,-0.635 38.703,0.635 39.718,0.635 39.718,-0.635 38.703,-0.635
Mechanical 15:
  lines w0.05: -40.227,-4.061 40.222,-4.061 40.222,4.061 -40.227,4.061 -40.227,-4.061
3D body "SAMTEC_QTH-120-05-L-D-A.stp": height 18.26, standoff -0.73, extent -39.977,-3.553 39.972,3.553